# Altium footprint library 3D_MIG_Controller.PCBLIB: 560 footprints (part 2 of 35)
Each footprint in its own frame and in the unit in brackets; x right, y up, seen from the top. Pads: shape width x height; smd on the part's side, far side on the other; paste and mask are expansions set on the pad; w line width, h text height; cw(c..) or ccw(c..) is an arc to the next point about the centre after c.
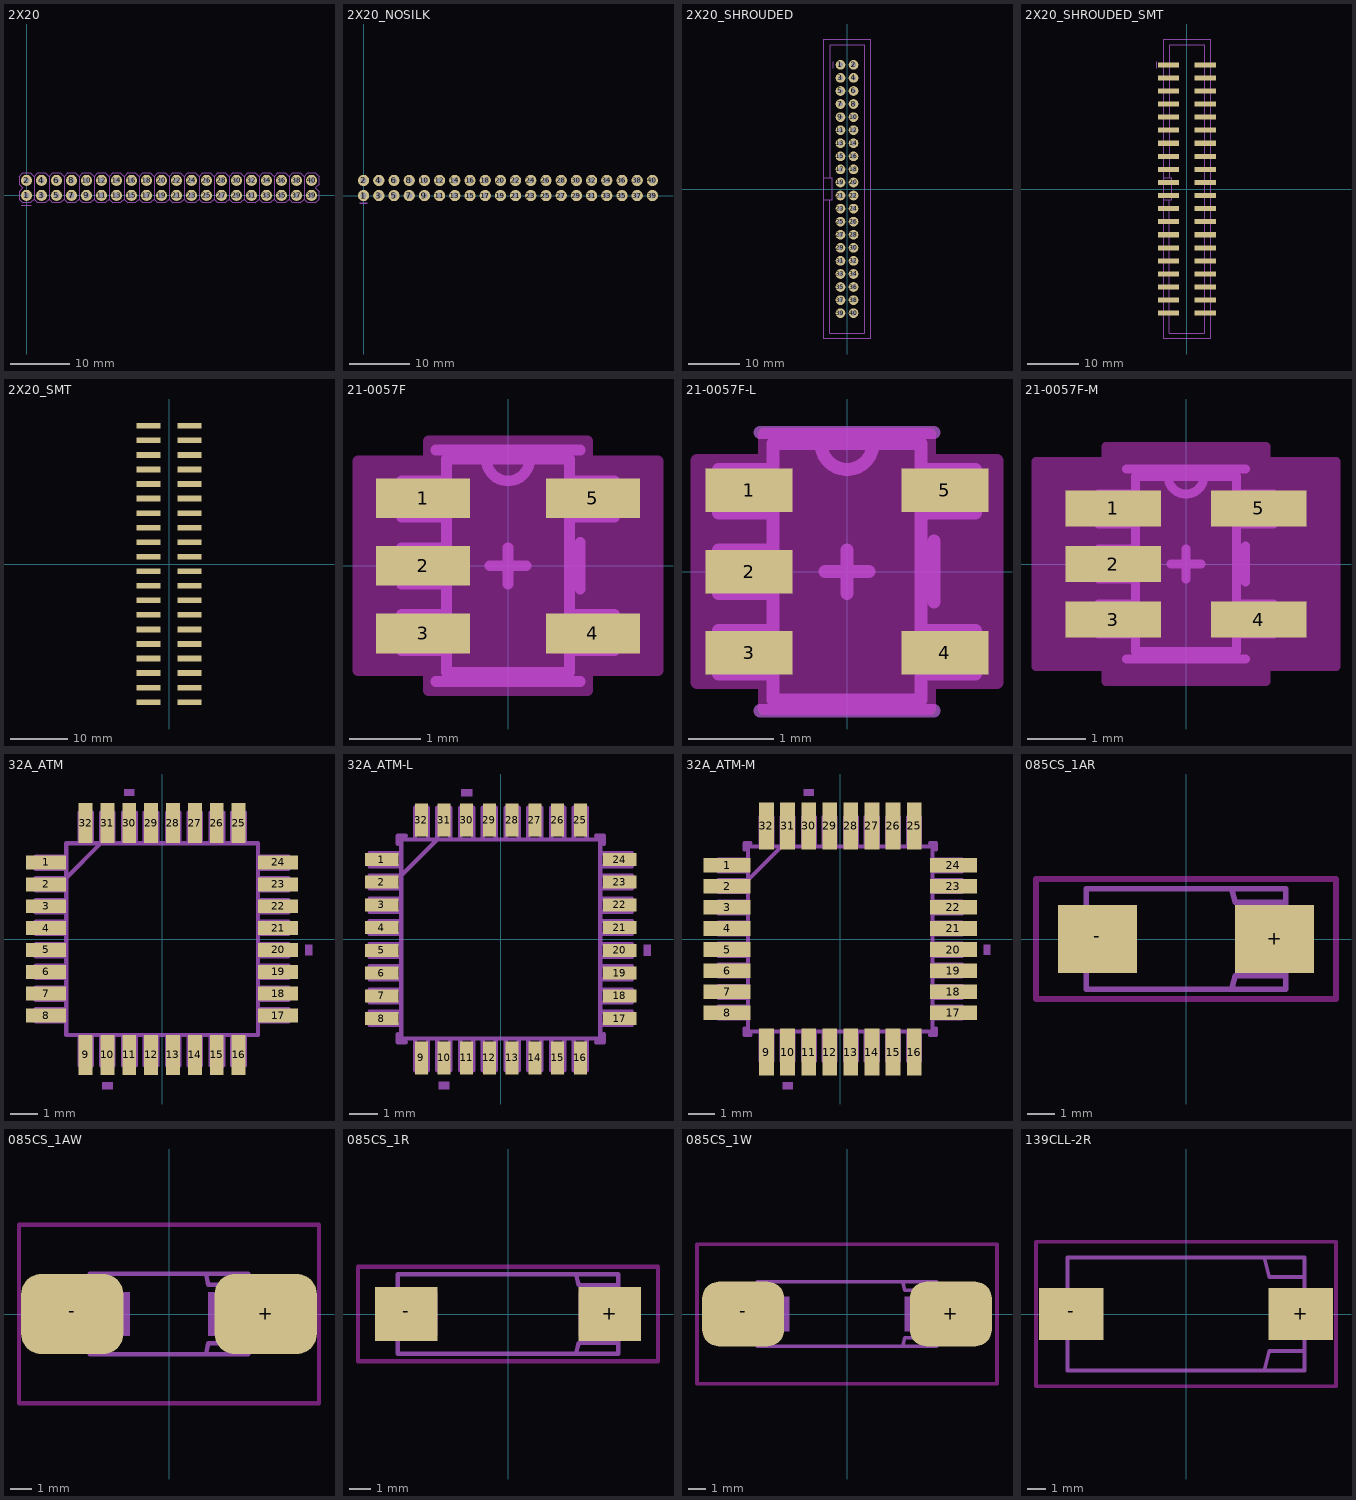
[diagram p1: the footprints below, top view; thin cyan lines are the x and y axes]

## 2X20 [mil]
pads (40):
  round 74 hole 40: 1(0,0) 2(0,100) 3(100,0) 4(100,100) 5(200,0) 6(200,100) 7(300,0) 8(300,100) 9(400,0) 10(400,100) 11(500,0) 12(500,100) 13(600,0) 14(600,100) 15(700,0) 16(700,100) 17(800,0) 18(800,100) 19(900,0) 20(900,100) 21(1000,0) 22(1000,100) 23(1100,0) 24(1100,100) 25(1200,0) 26(1200,100) 27(1300,0) 28(1300,100) 29(1400,0) 30(1400,100) 31(1500,0) 32(1500,100) 33(1600,0) 34(1600,100) 35(1700,0) 36(1700,100) 37(1800,0) 38(1800,100) 39(1900,0) 40(1900,100)
tDocu:
  drawing of 40 lines, arcs and shapes, not listed
tPlace:
  lines w8: -35,-65 30,-65 ; 50,-25 25,-50 -25,-50 -50,-25 -50,25 -25,50 -50,75 -50,125 -25,150 25,150 50,125 ; 50,-25 75,-50 125,-50 150,-25 ; 50,-25 50,125 ; 50,125 75,150 125,150 150,125 ; 150,-25 175,-50 225,-50 250,-25 ; 150,-25 150,125 ; 150,125 175,150 225,150 250,125 ; 250,-25 275,-50 325,-50 350,-25 ; 250,-25 250,125 ; 250,125 275,150 325,150 350,125 ; 350,-25 375,-50 425,-50 450,-25 ; 350,-25 350,125 ; 350,125 375,150 425,150 450,125 ; 450,-25 475,-50 525,-50 550,-25 ; 450,-25 450,125 ; 450,125 475,150 525,150 550,125 ; 550,-25 575,-50 625,-50 650,-25 ; 550,-25 550,125 ; 550,125 575,150 625,150 650,125 ; 650,-25 675,-50 725,-50 750,-25 ; 650,-25 650,125 ; 650,125 675,150 725,150 750,125 ; 750,-25 775,-50 825,-50 850,-25 ; 750,-25 750,125 ; 750,125 775,150 825,150 850,125 ; 850,-25 875,-50 925,-50 950,-25 ; 850,-25 850,125 ; 850,125 875,150 925,150 950,125 ; 950,-25 975,-50 1025,-50 1050,-25 ; 950,-25 950,125 ; 950,125 975,150 1025,150 1050,125 ; 1050,-25 1075,-50 1125,-50 1150,-25 ; 1050,-25 1050,125 ; 1050,125 1075,150 1125,150 1150,125 ; 1150,-25 1175,-50 1225,-50 1250,-25 ; 1150,-25 1150,125 ; 1150,125 1175,150 1225,150 1250,125 ; 1250,-25 1250,125 ; 1250,-25 1275,-50 1325,-50 1350,-25 ; 1250,125 1275,150 1325,150 1350,125 ; 1350,-25 1350,125 ; 1350,-25 1375,-50 1425,-50 1450,-25 ; 1350,125 1375,150 1425,150 1450,125 ; 1450,-25 1450,125 ; 1450,-25 1475,-50 1525,-50 1550,-25 ; 1450,125 1475,150 1525,150 1550,125 ; 1550,-25 1550,125 ; 1550,-25 1575,-50 1625,-50 1650,-25 ; 1550,125 1575,150 1625,150 1650,125 ; 1650,-25 1650,125 ; 1650,-25 1675,-50 1725,-50 1750,-25 ; 1650,125 1675,150 1725,150 1750,125 ; 1750,-25 1750,125 ; 1750,-25 1775,-50 1825,-50 1850,-25 ; 1750,125 1775,150 1825,150 1850,125 ; 1850,-25 1850,125 ; 1850,-25 1875,-50 1925,-50 1950,-25 1950,25 1925,50 1950,75 1950,125 1925,150 1875,150 1850,125
bPlace:
  lines w8: -35,-65 30,-65

## 2X20_NOSILK [mil]
pads (40):
  round 74 hole 40: 1(0,0) 2(0,100) 3(100,0) 4(100,100) 5(200,0) 6(200,100) 7(300,0) 8(300,100) 9(400,0) 10(400,100) 11(500,0) 12(500,100) 13(600,0) 14(600,100) 15(700,0) 16(700,100) 17(800,0) 18(800,100) 19(900,0) 20(900,100) 21(1000,0) 22(1000,100) 23(1100,0) 24(1100,100) 25(1200,0) 26(1200,100) 27(1300,0) 28(1300,100) 29(1400,0) 30(1400,100) 31(1500,0) 32(1500,100) 33(1600,0) 34(1600,100) 35(1700,0) 36(1700,100) 37(1800,0) 38(1800,100) 39(1900,0) 40(1900,100)
tDocu:
  drawing of 47 lines, arcs and shapes, not listed
bDocu:
  lines w8: -25,-50 25,-50

## 2X20_SHROUDED [mil]
pads (40):
  round 74 hole 40: 1(-50,950) 2(50,950) 3(-50,850) 4(50,850) 5(-50,750) 6(50,750) 7(-50,650) 8(50,650) 9(-50,550) 10(50,550) 11(-50,450) 12(50,450) 13(-50,350) 14(50,350) 15(-50,250) 16(50,250) 17(-50,150) 18(50,150) 19(-50,50) 20(50,50) 21(-50,-50) 22(50,-50) 23(-50,-150) 24(50,-150) 25(-50,-250) 26(50,-250) 27(-50,-350) 28(50,-350) 29(-50,-450) 30(50,-450) 31(-50,-550) 32(50,-550) 33(-50,-650) 34(50,-650) 35(-50,-750) 36(50,-750) 37(-50,-850) 38(50,-850) 39(-50,-950) 40(50,-950)
tDocu:
  drawing of 51 lines, arcs and shapes, not listed
tPlace:
  lines w8: -177.17,-86.61 -118.11,-86.61 -118.11,86.61 -177.17,86.61 ; -109.25,925 -109.25,975 ; 173.23,1147.64 -177.17,1147.64 -177.17,-1147.64 177.17,-1147.64 177.17,1147.64
bPlace:
  lines w8: -110.75,925 -110.75,975

## 2X20_SHROUDED_SMT [mil]
pads (40):
  rect 163x39 smd: 1(-140.5,950) 2(140.5,950) 3(-140.5,850) 4(140.5,850) 5(-140.5,750) 6(140.5,750) 7(-140.5,650) 8(140.5,650) 9(-140.5,550) 10(140.5,550) 11(-140.5,450) 12(140.5,450) 13(-140.5,350) 14(140.5,350) 15(-140.5,250) 16(140.5,250) 17(-140.5,150) 18(140.5,150) 19(-140.5,50) 20(140.5,50) 21(-140.5,-50) 22(140.5,-50) 23(-140.5,-150) 24(140.5,-150) 25(-140.5,-250) 26(140.5,-250) 27(-140.5,-350) 28(140.5,-350) 29(-140.5,-450) 30(140.5,-450) 31(-140.5,-550) 32(140.5,-550) 33(-140.5,-650) 34(140.5,-650) 35(-140.5,-750) 36(140.5,-750) 37(-140.5,-850) 38(140.5,-850) 39(-140.5,-950) 40(140.5,-950)
tDocu:
  lines w8: -133.86,-86.61 -133.86,-1104.33 133.86,-1104.33 133.86,1104.33 -133.86,1104.33 -133.86,86.61
tPlace:
  lines w8: -234.25,925 -234.25,975 ; -177.17,-86.61 -118.11,-86.61 -118.11,86.61 -177.17,86.61 ; 173.23,1147.64 -177.17,1147.64 -177.17,-1147.64 177.17,-1147.64 177.17,1147.64
bPlace:
  lines w8: -235.75,925 -235.75,975

## 2X20_SMT [mil]
pads (40):
  rect 163x39 smd: 1(-140.5,950) 2(140.5,950) 3(-140.5,850) 4(140.5,850) 5(-140.5,750) 6(140.5,750) 7(-140.5,650) 8(140.5,650) 9(-140.5,550) 10(140.5,550) 11(-140.5,450) 12(140.5,450) 13(-140.5,350) 14(140.5,350) 15(-140.5,250) 16(140.5,250) 17(-140.5,150) 18(140.5,150) 19(-140.5,50) 20(140.5,50) 21(-140.5,-50) 22(140.5,-50) 23(-140.5,-150) 24(140.5,-150) 25(-140.5,-250) 26(140.5,-250) 27(-140.5,-350) 28(140.5,-350) 29(-140.5,-450) 30(140.5,-450) 31(-140.5,-550) 32(140.5,-550) 33(-140.5,-650) 34(140.5,-650) 35(-140.5,-750) 36(140.5,-750) 37(-140.5,-850) 38(140.5,-850) 39(-140.5,-950) 40(140.5,-950)

## 21-0057F [mil]
pads (5):
  rect 52x22 smd: 1(-47,37.4) 2(-47,0) 3(-47,-37.4) 4(47,-37.4) 5(47,37.4)
Top keep-out:
  region: -44.5,-69 -44.5,-58.4 -83,-58.4 -83,58.4 -44.5,58.4 -44.5,69 44.5,69 44.5,58.4 83,58.4 83,-58.4 44.5,-58.4 44.5,-69
  lines w6: -83,-58 -44,-58 -44,-69 44,-69 44,-58 83,-58 83,58 44,58 44,69 -44,69 -44,58 -83,58 -83,-58
tDocu:
  lines w6: -34,-47 -34,-59 34,-59 34,-27 ; -34,-47 -34,-27 ; -34,-47 -59,-47 -59,-27 -34,-27 ; -34,-27 -34,-10 ; -34,-10 -34,27 ; -34,-10 -35,10 -59,10 -59,-10 -34,-10 ; -34,27 -34,59 -12,59 ; -34,27 -35,47 -59,47 -59,27 -34,27 ; -12,59 12,59 ; -12,59 ccw(c0,59) 12,59 ; 12,59 34,59 34,47 ; 34,-27 34,27 ; 34,-27 35,-47 59,-47 59,-27 34,-27 ; 34,27 34,47 ; 34,27 59,27 59,47 34,47
  text "*" at -47,16 h62
tPlace:
  lines w6: -40,-64 40,-64 ; -40,64 40,64 ; 40,-13 40,13
  text "*" at -80,54 h62
tOrigins:
  lines w6: -10,0 10,0 ; 0,-10 0,10

## 21-0057F-L [mil]
pads (5):
  rect 40x20 smd: 1(-45,37.4) 2(-45,0) 3(-45,-37.4) 4(45,-37.4) 5(45,37.4)
Top keep-out:
  region: -38.5,-63 -38.5,-51.4 -69,-51.4 -69,51.4 -38.5,51.4 -38.5,63 38.5,63 38.5,51.4 69,51.4 69,-51.4 38.5,-51.4 38.5,-63
  lines w6: -69,-51 -38,-51 -38,-63 38,-63 38,-51 69,-51 69,51 38,51 38,63 -38,63 -38,51 -69,51 -69,-51
tDocu:
  lines w6: -34,-47 -34,-59 34,-59 34,-27 ; -34,-47 -34,-27 ; -34,-47 -59,-47 -59,-27 -34,-27 ; -34,-27 -34,-10 ; -34,-10 -34,27 ; -34,-10 -35,10 -59,10 -59,-10 -34,-10 ; -34,27 -34,59 -12,59 ; -34,27 -35,47 -59,47 -59,27 -34,27 ; -12,59 12,59 ; -12,59 ccw(c0,59) 12,59 ; 12,59 34,59 34,47 ; 34,-27 34,27 ; 34,-27 35,-47 59,-47 59,-27 34,-27 ; 34,27 34,47 ; 34,27 59,27 59,47 34,47
  text "*" at -47,14 h62
tPlace:
  lines w6: -40,-64 40,-64 ; -40,64 40,64 ; 40,-14 40,14
  text "*" at -78,52 h62
tOrigins:
  lines w6: -10,0 10,0 ; 0,-10 0,10

## 21-0057F-M [mil]
pads (5):
  rect 64x24 smd: 1(-49,37.4) 2(-49,0) 3(-49,-37.4) 4(49,-37.4) 5(49,37.4)
Top keep-out:
  region: -54.5,-79 -54.5,-69.4 -101,-69.4 -101,69.4 -54.5,69.4 -54.5,79 54.5,79 54.5,69.4 101,69.4 101,-69.4 54.5,-69.4 54.5,-79
  lines w6: -101,-69 -54,-69 -54,-79 54,-79 54,-69 101,-69 101,69 54,69 54,79 -54,79 -54,69 -101,69 -101,-69
tDocu:
  lines w6: -34,-47 -34,-59 34,-59 34,-27 ; -34,-47 -34,-27 ; -34,-47 -59,-47 -59,-27 -34,-27 ; -34,-27 -34,-10 ; -34,-10 -34,27 ; -34,-10 -35,10 -59,10 -59,-10 -34,-10 ; -34,27 -34,59 -12,59 ; -34,27 -35,47 -59,47 -59,27 -34,27 ; -12,59 12,59 ; -12,59 ccw(c0,59) 12,59 ; 12,59 34,59 34,47 ; 34,-27 34,27 ; 34,-27 35,-47 59,-47 59,-27 34,-27 ; 34,27 34,47 ; 34,27 59,27 59,47 34,47
  text "*" at -47,18 h62
tPlace:
  lines w6: -40,-64 40,-64 ; -40,64 40,64 ; 40,-12 40,12
  text "*" at -82,56 h62
tOrigins:
  lines w6: -10,0 10,0 ; 0,-10 0,10

## 32A_ATM [mil]
pads (32):
  rect 58x20 smd: 1(-167,110.24) 2(-167,78.74) 3(-167,47.24) 4(-167,15.75) 5(-167,-15.75) 6(-167,-47.24) 7(-167,-78.74) 8(-167,-110.24) 17(167,-110.24) 18(167,-78.74) 19(167,-47.24) 20(167,-15.75) 21(167,15.75) 22(167,47.24) 23(167,78.74) 24(167,110.24)
  rect 20x58 smd: 9(-110.24,-167) 10(-78.74,-167) 11(-47.24,-167) 12(-15.75,-167) 13(15.75,-167) 14(47.24,-167) 15(78.74,-167) 16(110.24,-167) 25(110.24,167) 26(78.74,167) 27(47.24,167) 28(15.75,167) 29(-15.75,167) 30(-47.24,167) 31(-78.74,167) 32(-110.24,167)
tDocu:
  lines w6: -138,88 -138,70 -182,70 -182,88 -138,88 ; -138,88 -88,138 ; -88,138 -70,138 -70,182 -88,182 -88,138 ; -182,-119 -182,-101 -138,-101 -138,-119 -182,-119 ; -182,-88 -182,-70 -138,-70 -138,-88 -182,-88 ; -182,-56 -182,-38 -138,-38 -138,-56 -182,-56 ; -182,-25 -182,-7 -138,-7 -138,-25 -182,-25 ; -182,7 -182,25 -138,25 -138,7 -182,7 ; -182,38 -182,56 -138,56 -138,38 -182,38 ; -182,101 -182,119 -138,119 -138,101 -182,101 ; -138,-138 138,-138 138,138 -138,138 -138,-138 ; -119,-182 -119,-138 -101,-138 -101,-182 -119,-182 ; -119,138 -101,138 -101,182 -119,182 -119,138 ; -88,-182 -88,-138 -70,-138 -70,-182 -88,-182 ; -56,-182 -56,-138 -38,-138 -38,-182 -56,-182 ; -56,138 -38,138 -38,182 -56,182 -56,138 ; -25,-182 -25,-138 -7,-138 -7,-182 -25,-182 ; -25,138 -7,138 -7,182 -25,182 -25,138 ; 7,-182 7,-138 25,-138 25,-182 7,-182 ; 7,138 25,138 25,182 7,182 7,138 ; 38,-182 38,-138 56,-138 56,-182 38,-182 ; 38,138 56,138 56,182 38,182 38,138 ; 70,-182 70,-138 88,-138 88,-182 70,-182 ; 70,138 88,138 88,182 70,182 70,138 ; 101,-182 101,-138 119,-138 119,-182 101,-182 ; 101,138 119,138 119,182 101,182 101,138 ; 138,-119 138,-101 182,-101 182,-119 138,-119 ; 138,-88 138,-70 182,-70 182,-88 138,-88 ; 138,-56 138,-38 182,-38 182,-56 138,-56 ; 138,-25 138,-7 182,-7 182,-25 138,-25 ; 138,7 138,25 182,25 182,7 138,7 ; 138,38 138,56 182,56 182,38 138,38 ; 138,70 138,88 182,88 182,70 138,70 ; 138,101 138,119 182,119 182,101 138,101
  text "*" at -141,86 h77.5
tPlace:
  region: -86.24,-206 -86.24,-216 -71.24,-216 -71.24,-206
  region: 216,-8.25 216,-23.25 206,-23.25 206,-8.25
  region: -54.74,206 -54.74,216 -39.74,216 -39.74,206
  text "*" at -244,116 h77.5

## 32A_ATM-L [mil]
pads (32):
  rect 46x18 smd: 1(-165,110.24) 2(-165,78.74) 3(-165,47.24) 4(-165,15.75) 5(-165,-15.75) 6(-165,-47.24) 7(-165,-78.74) 8(-165,-110.24) 17(165,-110.24) 18(165,-78.74) 19(165,-47.24) 20(165,-15.75) 21(165,15.75) 22(165,47.24) 23(165,78.74) 24(165,110.24)
  rect 18x46 smd: 9(-110.24,-165) 10(-78.74,-165) 11(-47.24,-165) 12(-15.75,-165) 13(15.75,-165) 14(47.24,-165) 15(78.74,-165) 16(110.24,-165) 25(110.24,165) 26(78.74,165) 27(47.24,165) 28(15.75,165) 29(-15.75,165) 30(-47.24,165) 31(-78.74,165) 32(-110.24,165)
tDocu:
  lines w6: -138,88 -138,70 -182,70 -182,88 -138,88 ; -138,88 -88,138 ; -88,138 -70,138 -70,182 -88,182 -88,138 ; -182,-119 -182,-101 -138,-101 -138,-119 -182,-119 ; -182,-88 -182,-70 -138,-70 -138,-88 -182,-88 ; -182,-56 -182,-38 -138,-38 -138,-56 -182,-56 ; -182,-25 -182,-7 -138,-7 -138,-25 -182,-25 ; -182,7 -182,25 -138,25 -138,7 -182,7 ; -182,38 -182,56 -138,56 -138,38 -182,38 ; -182,101 -182,119 -138,119 -138,101 -182,101 ; -138,-138 138,-138 138,138 -138,138 -138,-138 ; -119,-182 -119,-138 -101,-138 -101,-182 -119,-182 ; -119,138 -101,138 -101,182 -119,182 -119,138 ; -88,-182 -88,-138 -70,-138 -70,-182 -88,-182 ; -56,-182 -56,-138 -38,-138 -38,-182 -56,-182 ; -56,138 -38,138 -38,182 -56,182 -56,138 ; -25,-182 -25,-138 -7,-138 -7,-182 -25,-182 ; -25,138 -7,138 -7,182 -25,182 -25,138 ; 7,-182 7,-138 25,-138 25,-182 7,-182 ; 7,138 25,138 25,182 7,182 7,138 ; 38,-182 38,-138 56,-138 56,-182 38,-182 ; 38,138 56,138 56,182 38,182 38,138 ; 70,-182 70,-138 88,-138 88,-182 70,-182 ; 70,138 88,138 88,182 70,182 70,138 ; 101,-182 101,-138 119,-138 119,-182 101,-182 ; 101,138 119,138 119,182 101,182 101,138 ; 138,-119 138,-101 182,-101 182,-119 138,-119 ; 138,-88 138,-70 182,-70 182,-88 138,-88 ; 138,-56 138,-38 182,-38 182,-56 138,-56 ; 138,-25 138,-7 182,-7 182,-25 138,-25 ; 138,7 138,25 182,25 182,7 138,7 ; 138,38 138,56 182,56 182,38 138,38 ; 138,70 138,88 182,88 182,70 138,70 ; 138,101 138,119 182,119 182,101 138,101
  text "*" at -145,86 h77.5
tPlace:
  region: -86.24,-198 -86.24,-208 -71.24,-208 -71.24,-198
  region: 208,-8.25 208,-23.25 198,-23.25 198,-8.25
  region: -54.74,198 -54.74,208 -39.74,208 -39.74,198
  lines w6: -143,-132 -143,-143 -132,-143 ; -143,132 -143,143 -132,143 ; 132,-143 143,-143 143,-132 ; 132,143 143,143 143,132
  text "*" at -236,116 h77.5

## 32A_ATM-M [mil]
pads (32):
  rect 70x22 smd: 1(-169,110.24) 2(-169,78.74) 3(-169,47.24) 4(-169,15.75) 5(-169,-15.75) 6(-169,-47.24) 7(-169,-78.74) 8(-169,-110.24) 17(169,-110.24) 18(169,-78.74) 19(169,-47.24) 20(169,-15.75) 21(169,15.75) 22(169,47.24) 23(169,78.74) 24(169,110.24)
  rect 22x70 smd: 9(-110.24,-169) 10(-78.74,-169) 11(-47.24,-169) 12(-15.75,-169) 13(15.75,-169) 14(47.24,-169) 15(78.74,-169) 16(110.24,-169) 25(110.24,169) 26(78.74,169) 27(47.24,169) 28(15.75,169) 29(-15.75,169) 30(-47.24,169) 31(-78.74,169) 32(-110.24,169)
tDocu:
  lines w6: -138,88 -138,70 -182,70 -182,88 -138,88 ; -138,88 -88,138 ; -88,138 -70,138 -70,182 -88,182 -88,138 ; -182,-119 -182,-101 -138,-101 -138,-119 -182,-119 ; -182,-88 -182,-70 -138,-70 -138,-88 -182,-88 ; -182,-56 -182,-38 -138,-38 -138,-56 -182,-56 ; -182,-25 -182,-7 -138,-7 -138,-25 -182,-25 ; -182,7 -182,25 -138,25 -138,7 -182,7 ; -182,38 -182,56 -138,56 -138,38 -182,38 ; -182,101 -182,119 -138,119 -138,101 -182,101 ; -138,-138 138,-138 138,138 -138,138 -138,-138 ; -119,-182 -119,-138 -101,-138 -101,-182 -119,-182 ; -119,138 -101,138 -101,182 -119,182 -119,138 ; -88,-182 -88,-138 -70,-138 -70,-182 -88,-182 ; -56,-182 -56,-138 -38,-138 -38,-182 -56,-182 ; -56,138 -38,138 -38,182 -56,182 -56,138 ; -25,-182 -25,-138 -7,-138 -7,-182 -25,-182 ; -25,138 -7,138 -7,182 -25,182 -25,138 ; 7,-182 7,-138 25,-138 25,-182 7,-182 ; 7,138 25,138 25,182 7,182 7,138 ; 38,-182 38,-138 56,-138 56,-182 38,-182 ; 38,138 56,138 56,182 38,182 38,138 ; 70,-182 70,-138 88,-138 88,-182 70,-182 ; 70,138 88,138 88,182 70,182 70,138 ; 101,-182 101,-138 119,-138 119,-182 101,-182 ; 101,138 119,138 119,182 101,182 101,138 ; 138,-119 138,-101 182,-101 182,-119 138,-119 ; 138,-88 138,-70 182,-70 182,-88 138,-88 ; 138,-56 138,-38 182,-38 182,-56 138,-56 ; 138,-25 138,-7 182,-7 182,-25 138,-25 ; 138,7 138,25 182,25 182,7 138,7 ; 138,38 138,56 182,56 182,38 138,38 ; 138,70 138,88 182,88 182,70 138,70 ; 138,101 138,119 182,119 182,101 138,101
  text "*" at -137,86 h77.5
tPlace:
  region: -86.24,-214 -86.24,-224 -71.24,-224 -71.24,-214
  region: 224,-8.25 224,-23.25 214,-23.25 214,-8.25
  region: -54.74,214 -54.74,224 -39.74,224 -39.74,214
  lines w6: -143,-134 -143,-143 -134,-143 ; -143,134 -143,143 -134,143 ; 134,-143 143,-143 143,-134 ; 134,143 143,143 143,134
  text "*" at -252,116 h77.5

## 085CS_1AR [mil]
pads (2):
  rect 114.17x98.43 smd: +(127.95,0) -(-127.95,0)
Top keep-out:
  lines w8: -216.54,-86.61 -216.54,86.61 216.54,86.61 216.54,-86.61 -216.54,-86.61
tDocu:
  region: 70.87,-39.37 70.87,39.37 163.39,39.37 163.39,-39.37
  region: -163.39,-39.37 -163.39,39.37 -70.87,39.37 -70.87,-39.37
  lines w4: -175.2,-27.56 -175.2,27.56 -165.35,37.4 -165.35,-37.4 -175.2,-27.56 ; 165.35,-37.4 175.2,-27.56 175.2,27.56 165.35,37.4 165.35,-37.4
  lines w8: -169.29,-29.53 -169.29,29.53 ; -143.7,-72.83 -143.7,72.83 ; 70.87,-53.15 141.73,-53.15 ; 70.87,53.15 139.76,53.15 ; 143.7,-72.83 143.7,72.83 ; 169.29,-29.53 169.29,29.53
tPlace:
  lines w8: -143.7,-72.83 143.7,-72.83 ; -143.7,72.83 143.7,72.83 ; 66.93,-68.9 70.87,-53.15 ; 66.93,68.9 70.87,53.15

## 085CS_1AW [mm]
pads (2):
  rrect50% 4.7x3.7 smd: +(4.45,0) -(-4.45,0)
Top keep-out:
  lines w0.203: -6.9,-4.1 -6.9,4.1 6.9,4.1 6.9,-4.1 -6.9,-4.1
tDocu:
  region: 1.8,-1 1.8,1 4.15,1 4.15,-1
  region: -4.15,-1 -4.15,1 -1.8,1 -1.8,-1
  lines w0.102: -4.45,-0.7 -4.45,0.7 -4.2,0.95 -4.2,-0.95 -4.45,-0.7 ; 4.2,-0.95 4.45,-0.7 4.45,0.7 4.2,0.95 4.2,-0.95
  lines w0.203: -4.3,-0.75 -4.3,0.75 ; -3.65,-1.85 -3.65,1.85 ; 1.7,-1.85 3.65,-1.85 3.65,1.85 1.7,1.85 ; 1.8,-1.35 3.6,-1.35 ; 1.8,1.35 3.55,1.35 ; 4.3,-0.75 4.3,0.75
tPlace:
  lines w0.203: -3.65,-1.85 1.7,-1.85 1.8,-1.35 ; -3.65,1.85 1.7,1.85 1.8,1.35

## 085CS_1R [mil]
pads (2):
  rect 114.17x98.43 smd: +(187.01,0) -(-187.01,0)
Top keep-out:
  lines w8: -275.59,-86.61 -275.59,86.61 275.59,86.61 275.59,-86.61 -275.59,-86.61
tDocu:
  region: 129.92,-39.37 129.92,39.37 222.44,39.37 222.44,-39.37
  region: -222.44,-39.37 -222.44,39.37 -129.92,39.37 -129.92,-39.37
  lines w4: -234.25,-27.56 -234.25,27.56 -224.41,37.4 -224.41,-37.4 -234.25,-27.56 ; 224.41,-37.4 234.25,-27.56 234.25,27.56 224.41,37.4 224.41,-37.4
  lines w8: -228.35,-29.53 -228.35,29.53 ; 129.92,-53.15 200.79,-53.15 ; 129.92,53.15 198.82,53.15 ; 202.76,-72.83 202.76,72.83 ; 228.35,-29.53 228.35,29.53
tPlace:
  lines w8: 125.98,-68.9 129.92,-53.15 ; 125.98,68.9 129.92,53.15 ; 202.76,-72.83 -202.76,-72.83 -202.76,72.83 202.76,72.83

## 085CS_1W [mm]
pads (2):
  rrect50% 4.7x3.7 smd: +(5.95,0) -(-5.95,0)
Top keep-out:
  lines w0.203: -8.6,-4 -8.6,4 8.6,4 8.6,-4 -8.6,-4
tDocu:
  region: 3.3,-1 3.3,1 5.65,1 5.65,-1
  region: -5.65,-1 -5.65,1 -3.3,1 -3.3,-1
  lines w0.102: -5.95,-0.7 -5.95,0.7 -5.7,0.95 -5.7,-0.95 -5.95,-0.7 ; 5.7,-0.95 5.95,-0.7 5.95,0.7 5.7,0.95 5.7,-0.95
  lines w0.203: -5.8,-0.75 -5.8,0.75 ; -5.15,-1.85 -5.15,1.85 ; 3.2,-1.85 5.15,-1.85 5.15,1.85 3.2,1.85 ; 3.3,-1.35 5.1,-1.35 ; 3.3,1.35 5.05,1.35 ; 5.8,-0.75 5.8,0.75
tPlace:
  lines w0.203: -5.15,-1.85 3.2,-1.85 3.3,-1.35 ; -5.15,1.85 3.2,1.85 3.3,1.35

## 139CLL-2R [mil]
pads (2):
  rect 137.8x110.24 smd: +(244.09,0) -(-244.09,0)
Top keep-out:
  lines w8: -318.9,-153.54 -318.9,153.54 318.9,153.54 318.9,-153.54 -318.9,-153.54
tDocu:
  region: 177.17,-39.37 177.17,39.37 269.69,39.37 269.69,-39.37
  region: -269.69,-39.37 -269.69,39.37 -177.17,39.37 -177.17,-39.37
  lines w8: -251.97,-62.99 -251.97,62.99 ; 251.97,-62.99 251.97,62.99
  lines w10: -281.5,-23.62 -271.65,-33.46 -271.65,33.46 -281.5,23.62 -281.5,-23.62 ; 271.65,-33.46 281.5,-23.62 281.5,23.62 271.65,33.46 271.65,-33.46
tPlace:
  lines w8: -251.97,-62.99 -251.97,-120.08 251.97,-120.08 251.97,-62.99 ; -251.97,62.99 -251.97,120.08 251.97,120.08 251.97,62.99 ; 167.32,-116.14 177.17,-78.74 250,-78.74 ; 167.32,116.14 177.17,78.74 250,78.74